# Altium footprint library Misc.PcbLib: 159 footprints (part 2 of 10)
Each footprint in its own frame and in the unit in brackets; x right, y up, seen from the top. Pads: shape width x height; smd on the part's side, far side on the other; paste and mask are expansions set on the pad; w line width, h text height; cw(c..) or ccw(c..) is an arc to the next point about the centre after c.
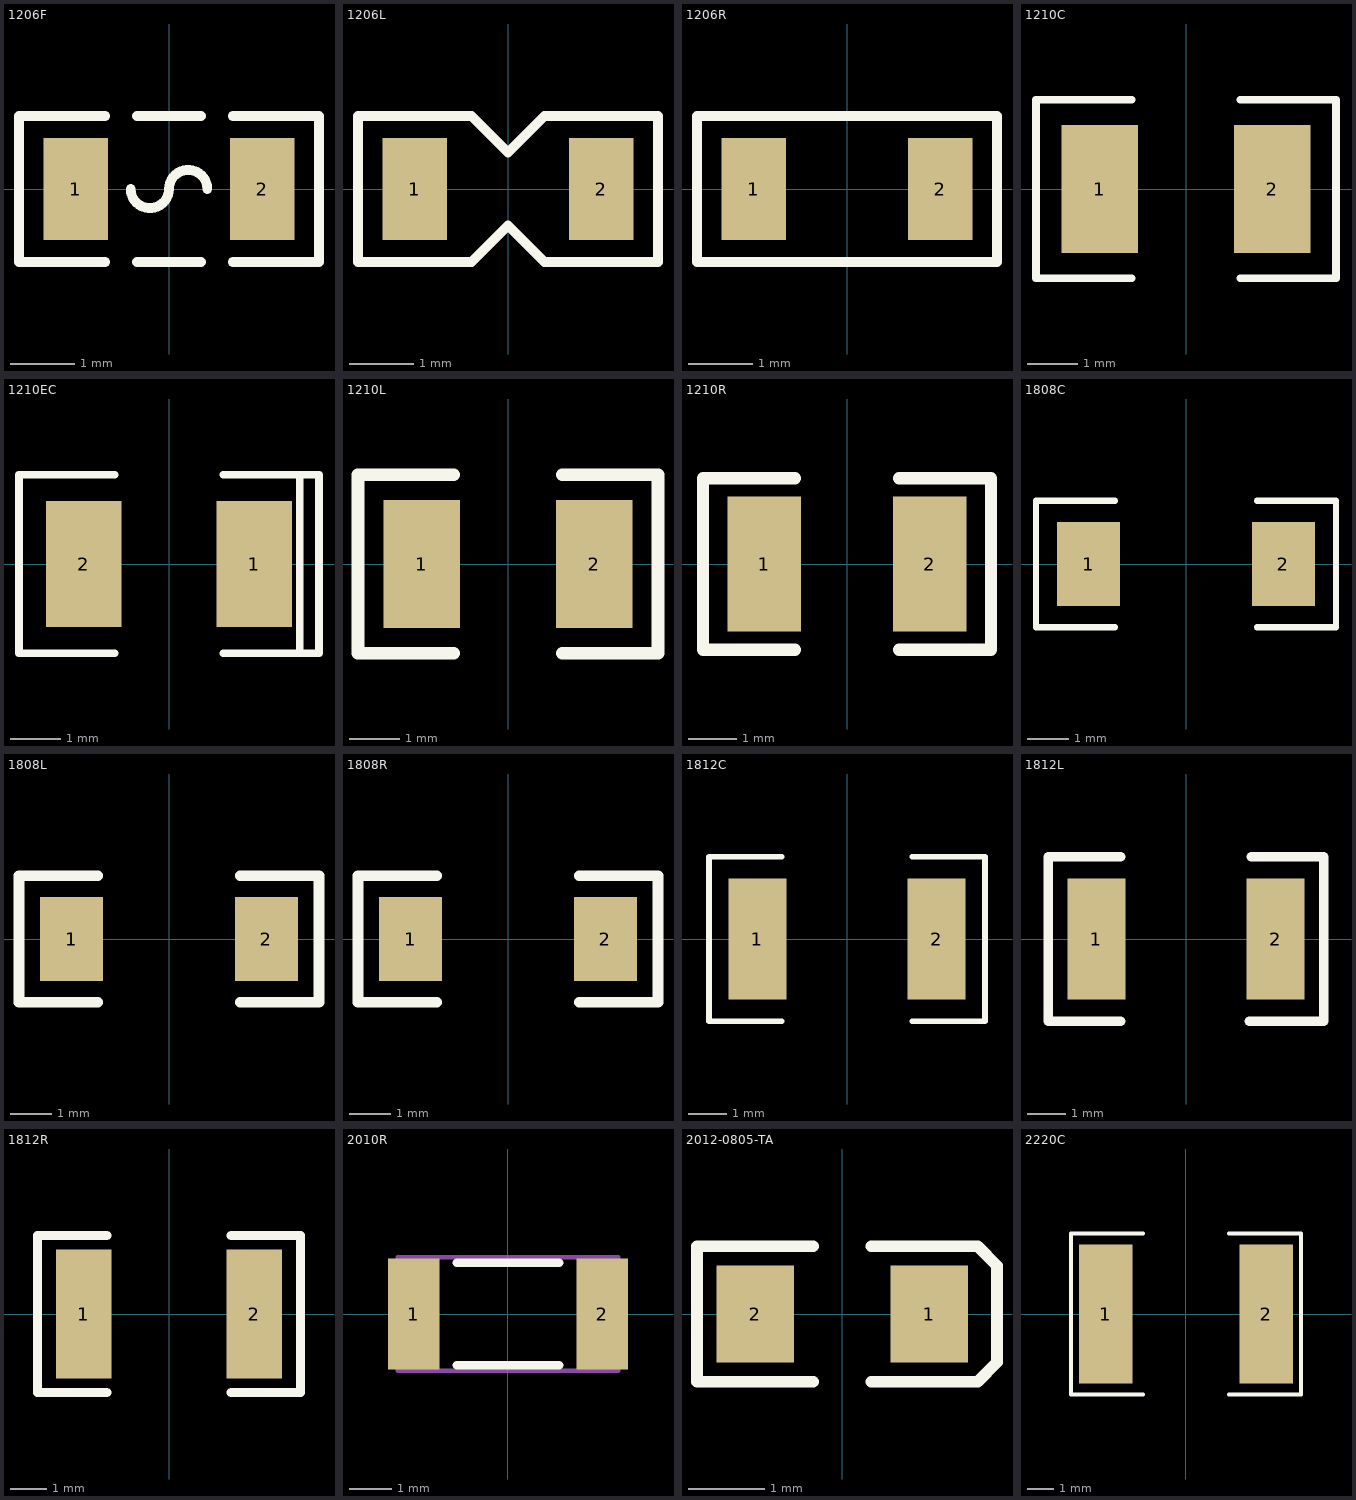
[diagram p1: the footprints below, top view; thin cyan lines are the x and y axes]

## 1206F [mil]
pads (2):
  rect 40x63 smd: 1(-57.5,0) 2(57.5,0)
Top Overlay:
  lines w6: -39.37,-45 -92.5,-45 -92.5,45 -39.37,45 ; -23.62,0 ccw(c-11.81,0) 0,0 cw(c11.81,0) 23.62,0 ; -19.68,-45 19.68,-45 ; -19.68,45 19.68,45 ; 39.37,-45 92.5,-45 92.5,45 39.37,45
3D body "User Library-RES_3216-1206.STEP": height 33.46, standoff 0, extent -63.44,-34.05 68.45,34.06

## 1206L [mil] "1/4W"
pads (2):
  rect 40x63 smd: 1(-57.5,0) 2(57.5,0)
Top Overlay:
  lines w6: -92.5,-45 -92.5,45 -22.5,45 0,22.5 22.5,45 92.5,45 92.5,-45 22.5,-45 0,-22.5 -22.5,-45 -92.5,-45
3D body "V1206HD.STEP": height 62.99, standoff 0, extent -60.49,-30 65.49,29.06

## 1206R [mil]
pads (2):
  rect 40x63 smd: 1(-57.5,0) 2(57.5,0)
Top Overlay:
  lines w6: -92.5,-45 92.5,-45 92.5,45 -92.5,45 -92.5,-45
3D body "User Library-RES_3216-1206.STEP": height 33.46, standoff 0, extent -63.44,-34.05 68.45,34.06

## 1210C [mil]
pads (2):
  rect 60x100 smd: 1(-67.5,0) 2(67.5,0)
Top Overlay:
  lines w5.91: -42.5,-70 -117.5,-70 -117.5,70 -42.5,70 ; 42.5,-70 117.5,-70 117.5,70 42.5,70
3D body "User Library-cap_1210_lowprofile.step": height 51.18, standoff 0, extent -62.99,-49.21 62.99,49.21

## 1210EC [mm]
pads (2):
  rect 1.5x2.5 smd: 1(1.7,0) 2(-1.7,0)
Top Overlay:
  lines w0.15: -1.079,-1.778 -2.984,-1.778 -2.984,1.778 -1.079,1.778 ; 1.079,-1.778 2.984,-1.778 2.984,1.778 1.079,1.778 ; 2.605,-1.746 2.605,1.777
3D body "User Library-cap_b.step": height -0.43, standoff -2.34, extent -1.746,-1.4 1.746,1.4

## 1210L [mil]
pads (2):
  rect 60x100 smd: 1(-67.5,0) 2(67.5,0)
Top Overlay:
  lines w10: -42.5,-70 -117.5,-70 -117.5,70 -42.5,70 ; 42.5,-70 117.5,-70 117.5,70 42.5,70
3D body "L1210.STEP": height 78.74, standoff 0, extent -60.41,-51.96 63.61,46.48

## 1210R [mil]
pads (2):
  rect 60x110 smd: 1(-67.5,0) 2(67.5,0)
Top Overlay:
  lines w10: -42.5,-70 -117.5,-70 -117.5,70 -42.5,70 ; 42.5,-70 117.5,-70 117.5,70 42.5,70
3D body "User Library-res1210.STEP": height 24.79, standoff 0, extent -86.18,-52 79.18,54.3

## 1808C [mil]
pads (2):
  rect 60x80 smd: 1(-92.5,0) 2(92.5,0)
Top Overlay:
  lines w5.91: -67.5,-60 -142.5,-60 -142.5,60 -67.5,60 ; 67.5,-60 142.5,-60 142.5,60 67.5,60
3D body "User Library-cap_1808_low.step": height 53.15, standoff 0, extent -90.55,-39.37 90.55,39.37

## 1808L [mil]
pads (2):
  rect 60x80 smd: 1(-92.5,0) 2(92.5,0)
Top Overlay:
  lines w10: -67.5,-60 -142.5,-60 -142.5,60 -67.5,60 ; 67.5,-60 142.5,-60 142.5,60 67.5,60
3D body "R1808(4520M)1.STEP": height 39.37, standoff 0, extent -90.5,-39 87.27,37.48

## 1808R [mil]
pads (2):
  rect 60x80 smd: 1(-92.5,0) 2(92.5,0)
Top Overlay:
  lines w10: -67.5,-60 -142.5,-60 -142.5,60 -67.5,60 ; 67.5,-60 142.5,-60 142.5,60 67.5,60
3D body "R1808(4520M)1.STEP": height 39.37, standoff 0, extent -90.5,-39 87.27,37.48

## 1812C [mil]
pads (2):
  rect 60x125 smd: 1(-92.5,0) 2(92.5,0)
Top Overlay:
  lines w5.91: -67.5,-85 -142.5,-85 -142.5,85 -67.5,85 ; 67.5,-85 142.5,-85 142.5,85 67.5,85
3D body "User Library-cap_1812_low.step": height 59.06, standoff 0, extent -90.55,-62.99 90.55,63

## 1812L [mil]
pads (2):
  rect 60x125 smd: 1(-92.5,0) 2(92.5,0)
Top Overlay:
  lines w10: -67.5,-85 -142.5,-85 -142.5,85 -67.5,85 ; 65.5,-85 67.5,-85 142.5,-85 142.5,85 67.5,85 ; 66.5,-85 68.5,-85
3D body "L1812.STEP": height 118.11, standoff -2.01, extent -90.61,-63 91.61,62.98

## 1812R [mil]
pads (2):
  rect 60x140 smd: 1(-92.5,0) 2(92.5,0)
Top Overlay:
  lines w10: -67.5,-85 -142.5,-85 -142.5,85 -67.5,85 ; 67.5,-85 142.5,-85 142.5,85 67.5,85
3D body "SW3dPS-1812 SMD Resistor.STEP": height 63.07, standoff 0, extent -89.08,-62 88.09,63.99

## 2010R [mm] "3/4W"
height 0.9
pads (2):
  rect 1.2x2.6 smd: 1(-2.2,0) 2(2.2,0)
Top Overlay:
  lines w0.2: -1.2,-1.2 1.2,-1.2 ; -1.2,1.2 1.2,1.2
Mechanical 13:
  lines w0.1: -2.575,-1.325 2.575,-1.325 2.575,1.325 -2.575,1.325 -2.575,-1.325
3D body "User Library-res2010.STEP": height 0.57, standoff -0.05, extent -3,-1.35 3,1.35

## 2012-0805-TA [mil]
pads (2):
  rect 40x50 smd: 1(45,0) 2(-45,0)
Top Overlay:
  lines w6: -15,-35 -75,-35 -75,35 -15,35 ; 15,-35 70,-35 80,-25 80,25 70,35 15,35

## 2220C [mm]
pads (2):
  rect 2x5.2 smd: 1(-3,0) 2(3,0)
Top Overlay:
  lines w0.15: -1.613,-3 -4.3,-3 -4.3,3 -1.613,3 ; 1.613,-3 4.3,-3 4.3,3 1.613,3
3D body "User Library-CAPC5750X23.step": height 2.3, standoff 0, extent -2.85,-2.5 2.85,2.5